# Altium schematic symbol library jlcpcb_2025_04_capacitors_extended_1210.schlib: 709 symbols (part 2 of 4) (continued)
## CC1210KKX7RYBB224
designator C?  Capacitance: 220nF  (hidden comment: *)
Capacitor, Ceramic (MLCC), 220nF, ±10%, 250V, X7R, ±10%, SMD 1210; Manufacturer: YAGEO; Manufacturer Part Number: CC1210KKX7RYBB224; Package Size: 1210; JLCPCB Basic Part: No; JLCPCB Part Number: C326671; Supplier 1: LCSC; Category: Capacitors - MLCC; Supplier Part Number 1: C326671; Tolerance: ±10%; Voltage Rating: 250V; Temperature Coefficient: X7R; RoHS: Yes; ComponentLink1Description: Datasheet; ComponentLink1URL: https://wmsc.lcsc.com/wmsc/upload/file/pdf/v2/lcsc/1811141240_YAGEO-CC1210KKX7RYBB224_C326671.pdf; ComponentLink2Description: JLCPCB Part URL; ComponentLink2URL: https://jlcpcb.com/partdetail/C326671; ComponentLink3Description: LCSC Part URL; ComponentLink3URL: https://lcsc.com/product-detail/Multilayer-Ceramic-Capacitors-MLCC---SMD-SMT_YAGEO-YAGEO-CC1210KKX7RYBB224_C326671.html
footprint CAP-1210 (1210 (3225M) Capacitor)
pins: 1, 2

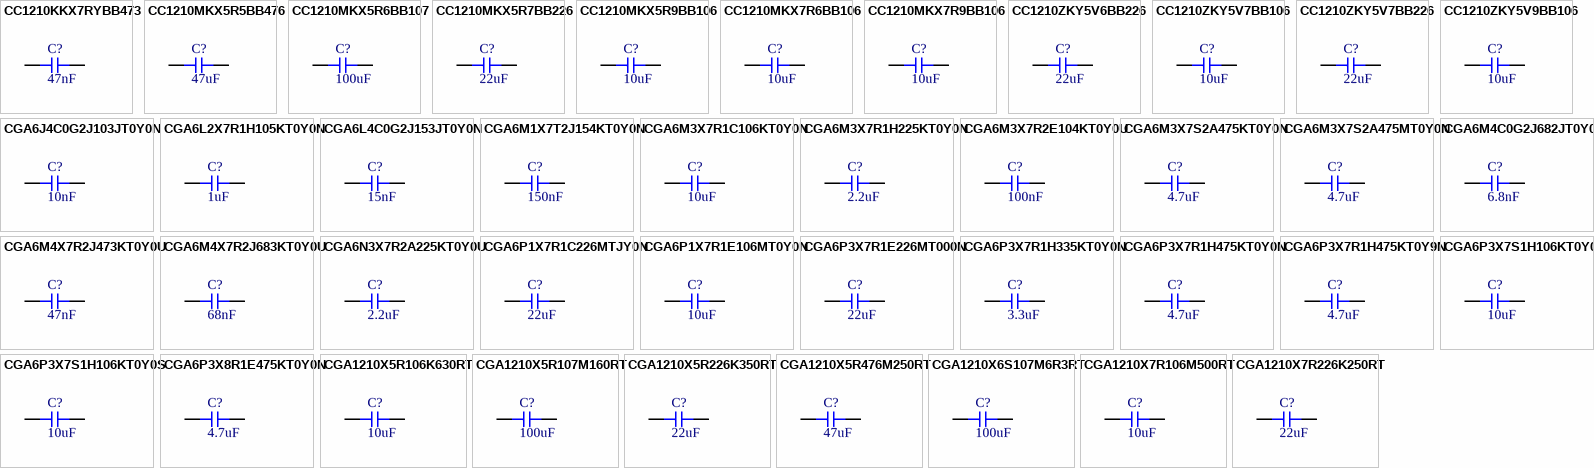
[diagram p8: symbols CC1210KKX7RYBB473 to CGA1210X7R226K250RT]

## CC1210KKX7RYBB473
designator C?  Capacitance: 47nF  (hidden comment: *)
Capacitor, Ceramic (MLCC), 47nF, ±10%, 250V, X7R, ±10%, SMD 1210; Manufacturer: YAGEO; Manufacturer Part Number: CC1210KKX7RYBB473; Package Size: 1210; JLCPCB Basic Part: No; JLCPCB Part Number: C527382; Supplier 1: LCSC; Category: Capacitors - MLCC; Supplier Part Number 1: C527382; Tolerance: ±10%; Voltage Rating: 250V; Temperature Coefficient: X7R; RoHS: Yes; ComponentLink1Description: Datasheet; ComponentLink1URL: https://wmsc.lcsc.com/wmsc/upload/file/pdf/v2/lcsc/2006101836_YAGEO-CC1210KKX7RYBB473_C527382.pdf; ComponentLink2Description: JLCPCB Part URL; ComponentLink2URL: https://jlcpcb.com/partdetail/C527382; ComponentLink3Description: LCSC Part URL; ComponentLink3URL: https://lcsc.com/product-detail/Multilayer-Ceramic-Capacitors-MLCC---SMD-SMT_YAGEO-YAGEO-CC1210KKX7RYBB473_C527382.html
footprint CAP-1210 (1210 (3225M) Capacitor)
pins: 1, 2

## CC1210MKX5R5BB476
designator C?  Capacitance: 47uF  (hidden comment: *)
Capacitor, Ceramic (MLCC), 47uF, ±20%, 6.3V, X5R, ±20%, SMD 1210; Manufacturer: YAGEO; Manufacturer Part Number: CC1210MKX5R5BB476; Package Size: 1210; JLCPCB Basic Part: No; JLCPCB Part Number: C309506; Supplier 1: LCSC; Category: Capacitors - MLCC; Supplier Part Number 1: C309506; Tolerance: ±20%; Voltage Rating: 6.3V; Temperature Coefficient: X5R; RoHS: Yes; ComponentLink1Description: Datasheet; ComponentLink1URL: https://wmsc.lcsc.com/wmsc/upload/file/pdf/v2/lcsc/2407081117_YAGEO-CC1210MKX5R5BB476_C309506.pdf; ComponentLink2Description: JLCPCB Part URL; ComponentLink2URL: https://jlcpcb.com/partdetail/C309506; ComponentLink3Description: LCSC Part URL; ComponentLink3URL: https://lcsc.com/product-detail/Multilayer-Ceramic-Capacitors-MLCC---SMD-SMT_YAGEO-YAGEO-CC1210MKX5R5BB476_C309506.html
footprint CAP-1210 (1210 (3225M) Capacitor)
pins: 1, 2

## CC1210MKX5R6BB107
designator C?  Capacitance: 100uF  (hidden comment: *)
Capacitor, Ceramic (MLCC), 100uF, ±20%, 10V, X5R, ±20%, SMD 1210; Manufacturer: YAGEO; Manufacturer Part Number: CC1210MKX5R6BB107; Package Size: 1210; JLCPCB Basic Part: No; JLCPCB Part Number: C723734; Supplier 1: LCSC; Category: Capacitors - MLCC; Supplier Part Number 1: C723734; Tolerance: ±20%; Voltage Rating: 10V; Temperature Coefficient: X5R; RoHS: Yes; ComponentLink1Description: Datasheet; ComponentLink1URL: https://wmsc.lcsc.com/wmsc/upload/file/pdf/v2/lcsc/2407081117_YAGEO-CC1210MKX5R6BB107_C723734.pdf; ComponentLink2Description: JLCPCB Part URL; ComponentLink2URL: https://jlcpcb.com/partdetail/C723734; ComponentLink3Description: LCSC Part URL; ComponentLink3URL: https://lcsc.com/product-detail/Multilayer-Ceramic-Capacitors-MLCC---SMD-SMT_YAGEO-YAGEO-CC1210MKX5R6BB107_C723734.html
footprint CAP-1210 (1210 (3225M) Capacitor)
pins: 1, 2

## CC1210MKX5R7BB226
designator C?  Capacitance: 22uF  (hidden comment: *)
Capacitor, Ceramic (MLCC), 22uF, ±20%, 16V, X5R, ±20%, SMD 1210; Manufacturer: YAGEO; Manufacturer Part Number: CC1210MKX5R7BB226; Package Size: 1210; JLCPCB Basic Part: No; JLCPCB Part Number: C2180585; Supplier 1: LCSC; Category: Capacitors - MLCC; Supplier Part Number 1: C2180585; Tolerance: ±20%; Voltage Rating: 16V; Temperature Coefficient: X5R; RoHS: Yes; ComponentLink1Description: Datasheet; ComponentLink1URL: https://wmsc.lcsc.com/wmsc/upload/file/pdf/v2/lcsc/2407081117_YAGEO-CC1210MKX5R7BB226_C2180585.pdf; ComponentLink2Description: JLCPCB Part URL; ComponentLink2URL: https://jlcpcb.com/partdetail/C2180585; ComponentLink3Description: LCSC Part URL; ComponentLink3URL: https://lcsc.com/product-detail/Multilayer-Ceramic-Capacitors-MLCC---SMD-SMT_YAGEO-YAGEO-CC1210MKX5R7BB226_C2180585.html
footprint CAP-1210 (1210 (3225M) Capacitor)
pins: 1, 2

## CC1210MKX5R9BB106
designator C?  Capacitance: 10uF  (hidden comment: *)
Capacitor, Ceramic (MLCC), 10uF, ±20%, 50V, X5R, ±20%, SMD 1210; Manufacturer: YAGEO; Manufacturer Part Number: CC1210MKX5R9BB106; Package Size: 1210; JLCPCB Basic Part: No; JLCPCB Part Number: C2177152; Supplier 1: LCSC; Category: Capacitors - MLCC; Supplier Part Number 1: C2177152; Tolerance: ±20%; Voltage Rating: 50V; Temperature Coefficient: X5R; RoHS: Yes; ComponentLink1Description: Datasheet; ComponentLink1URL: https://wmsc.lcsc.com/wmsc/upload/file/pdf/v2/lcsc/2407081117_YAGEO-CC1210MKX5R9BB106_C2177152.pdf; ComponentLink2Description: JLCPCB Part URL; ComponentLink2URL: https://jlcpcb.com/partdetail/C2177152; ComponentLink3Description: LCSC Part URL; ComponentLink3URL: https://lcsc.com/product-detail/Multilayer-Ceramic-Capacitors-MLCC---SMD-SMT_YAGEO-YAGEO-CC1210MKX5R9BB106_C2177152.html
footprint CAP-1210 (1210 (3225M) Capacitor)
pins: 1, 2

## CC1210MKX7R6BB106
designator C?  Capacitance: 10uF  (hidden comment: *)
Capacitor, Ceramic (MLCC), 10uF, ±20%, 10V, X7R, ±20%, SMD 1210; Manufacturer: YAGEO; Manufacturer Part Number: CC1210MKX7R6BB106; Package Size: 1210; JLCPCB Basic Part: No; JLCPCB Part Number: C1952584; Supplier 1: LCSC; Category: Capacitors - MLCC; Supplier Part Number 1: C1952584; Tolerance: ±20%; Voltage Rating: 10V; Temperature Coefficient: X7R; RoHS: Yes; ComponentLink1Description: Datasheet; ComponentLink1URL: https://wmsc.lcsc.com/wmsc/upload/file/pdf/v2/lcsc/2201291000_YAGEO-CC1210MKX7R6BB106_C1952584.pdf; ComponentLink2Description: JLCPCB Part URL; ComponentLink2URL: https://jlcpcb.com/partdetail/C1952584; ComponentLink3Description: LCSC Part URL; ComponentLink3URL: https://lcsc.com/product-detail/Multilayer-Ceramic-Capacitors-MLCC---SMD-SMT_YAGEO-YAGEO-CC1210MKX7R6BB106_C1952584.html
footprint CAP-1210 (1210 (3225M) Capacitor)
pins: 1, 2

## CC1210MKX7R9BB106
designator C?  Capacitance: 10uF  (hidden comment: *)
Capacitor, Ceramic (MLCC), 10uF, ±20%, 50V, X7R, ±20%, SMD 1210; Manufacturer: YAGEO; Manufacturer Part Number: CC1210MKX7R9BB106; Package Size: 1210; JLCPCB Basic Part: No; JLCPCB Part Number: C2181791; Supplier 1: LCSC; Category: Capacitors - MLCC; Supplier Part Number 1: C2181791; Tolerance: ±20%; Voltage Rating: 50V; Temperature Coefficient: X7R; RoHS: Yes; ComponentLink1Description: Datasheet; ComponentLink1URL: https://wmsc.lcsc.com/wmsc/upload/file/pdf/v2/lcsc/2202041230_YAGEO-CC1210MKX7R9BB106_C2181791.pdf; ComponentLink2Description: JLCPCB Part URL; ComponentLink2URL: https://jlcpcb.com/partdetail/C2181791; ComponentLink3Description: LCSC Part URL; ComponentLink3URL: https://lcsc.com/product-detail/Multilayer-Ceramic-Capacitors-MLCC---SMD-SMT_YAGEO-YAGEO-CC1210MKX7R9BB106_C2181791.html
footprint CAP-1210 (1210 (3225M) Capacitor)
pins: 1, 2

## CC1210ZKY5V6BB226
designator C?  Capacitance: 22uF  (hidden comment: *)
Capacitor, Ceramic (MLCC), 22uF, 10V, Y5V, SMD 1210; Manufacturer: YAGEO; Manufacturer Part Number: CC1210ZKY5V6BB226; Temperature Rating: -20%~+80%; Package Size: 1210; JLCPCB Basic Part: No; JLCPCB Part Number: C577288; Supplier 1: LCSC; Category: Capacitors - MLCC; Supplier Part Number 1: C577288; Voltage Rating: 10V; Temperature Coefficient: Y5V; RoHS: Yes; ComponentLink1Description: Datasheet; ComponentLink1URL: https://wmsc.lcsc.com/wmsc/upload/file/pdf/v2/lcsc/2311211121_YAGEO-CC1210ZKY5V6BB226_C577288.pdf; ComponentLink2Description: JLCPCB Part URL; ComponentLink2URL: https://jlcpcb.com/partdetail/C577288; ComponentLink3Description: LCSC Part URL; ComponentLink3URL: https://lcsc.com/product-detail/Multilayer-Ceramic-Capacitors-MLCC---SMD-SMT_YAGEO-YAGEO-CC1210ZKY5V6BB226_C577288.html
footprint CAP-1210 (1210 (3225M) Capacitor)
pins: 1, 2

## CC1210ZKY5V7BB106
designator C?  Capacitance: 10uF  (hidden comment: *)
Capacitor, Ceramic (MLCC), 10uF, 16V, Y5V, SMD 1210; Manufacturer: YAGEO; Manufacturer Part Number: CC1210ZKY5V7BB106; Temperature Rating: -20%~+80%; Package Size: 1210; JLCPCB Basic Part: No; JLCPCB Part Number: C577289; Supplier 1: LCSC; Category: Capacitors - MLCC; Supplier Part Number 1: C577289; Voltage Rating: 16V; Temperature Coefficient: Y5V; RoHS: Yes; ComponentLink1Description: Datasheet; ComponentLink1URL: https://wmsc.lcsc.com/wmsc/upload/file/pdf/v2/lcsc/2204121100_YAGEO-CC1210ZKY5V7BB106_C577289.pdf; ComponentLink2Description: JLCPCB Part URL; ComponentLink2URL: https://jlcpcb.com/partdetail/C577289; ComponentLink3Description: LCSC Part URL; ComponentLink3URL: https://lcsc.com/product-detail/Multilayer-Ceramic-Capacitors-MLCC---SMD-SMT_YAGEO-YAGEO-CC1210ZKY5V7BB106_C577289.html
footprint CAP-1210 (1210 (3225M) Capacitor)
pins: 1, 2

## CC1210ZKY5V7BB226
designator C?  Capacitance: 22uF  (hidden comment: *)
Capacitor, Ceramic (MLCC), 22uF, 16V, Y5V, SMD 1210; Manufacturer: YAGEO; Manufacturer Part Number: CC1210ZKY5V7BB226; Temperature Rating: -20%~+80%; Package Size: 1210; JLCPCB Basic Part: No; JLCPCB Part Number: C527383; Supplier 1: LCSC; Category: Capacitors - MLCC; Supplier Part Number 1: C527383; Voltage Rating: 16V; Temperature Coefficient: Y5V; RoHS: Yes; ComponentLink1Description: Datasheet; ComponentLink1URL: https://wmsc.lcsc.com/wmsc/upload/file/pdf/v2/lcsc/2005261833_YAGEO-CC1210ZKY5V7BB226_C527383.pdf; ComponentLink2Description: JLCPCB Part URL; ComponentLink2URL: https://jlcpcb.com/partdetail/C527383; ComponentLink3Description: LCSC Part URL; ComponentLink3URL: https://lcsc.com/product-detail/Multilayer-Ceramic-Capacitors-MLCC---SMD-SMT_YAGEO-YAGEO-CC1210ZKY5V7BB226_C527383.html
footprint CAP-1210 (1210 (3225M) Capacitor)
pins: 1, 2

## CC1210ZKY5V9BB106
designator C?  Capacitance: 10uF  (hidden comment: *)
Capacitor, Ceramic (MLCC), 10uF, 50V, Y5V, SMD 1210; Manufacturer: YAGEO; Manufacturer Part Number: CC1210ZKY5V9BB106; Temperature Rating: -20%~+80%; Package Size: 1210; JLCPCB Basic Part: No; JLCPCB Part Number: C577291; Supplier 1: LCSC; Category: Capacitors - MLCC; Supplier Part Number 1: C577291; Voltage Rating: 50V; Temperature Coefficient: Y5V; RoHS: Yes; ComponentLink1Description: Datasheet; ComponentLink1URL: https://wmsc.lcsc.com/wmsc/upload/file/pdf/v2/lcsc/2006091815_YAGEO-CC1210ZKY5V9BB106_C577291.pdf; ComponentLink2Description: JLCPCB Part URL; ComponentLink2URL: https://jlcpcb.com/partdetail/C577291; ComponentLink3Description: LCSC Part URL; ComponentLink3URL: https://lcsc.com/product-detail/Multilayer-Ceramic-Capacitors-MLCC---SMD-SMT_YAGEO-YAGEO-CC1210ZKY5V9BB106_C577291.html
footprint CAP-1210 (1210 (3225M) Capacitor)
pins: 1, 2

## CGA6J4C0G2J103JT0Y0N
designator C?  Capacitance: 10nF  (hidden comment: *)
Capacitor, Ceramic (MLCC), 10nF, ±5%, 630V, C0G, ±5%, SMD 1210; Manufacturer: TDK; Manufacturer Part Number: CGA6J4C0G2J103JT0Y0N; Package Size: 1210; JLCPCB Basic Part: No; JLCPCB Part Number: C338089; Supplier 1: LCSC; Category: Capacitors - MLCC; Supplier Part Number 1: C338089; Tolerance: ±5%; Voltage Rating: 630V; Temperature Coefficient: C0G; RoHS: Yes; ComponentLink1Description: Datasheet; ComponentLink1URL: https://wmsc.lcsc.com/wmsc/upload/file/pdf/v2/lcsc/2304140030_TDK-CGA6J4C0G2J103JT0Y0N_C338089.pdf; ComponentLink2Description: JLCPCB Part URL; ComponentLink2URL: https://jlcpcb.com/partdetail/C338089; ComponentLink3Description: LCSC Part URL; ComponentLink3URL: https://lcsc.com/product-detail/Multilayer-Ceramic-Capacitors-MLCC---SMD-SMT_TDK-TDK-CGA6J4C0G2J103JT0Y0N_C338089.html
footprint CAP-1210 (1210 (3225M) Capacitor)
pins: 1, 2

## CGA6L2X7R1H105KT0Y0N
designator C?  Capacitance: 1uF  (hidden comment: *)
Capacitor, Ceramic (MLCC), 1uF, ±10%, 50V, X7R, ±10%, SMD 1210; Manufacturer: TDK; Manufacturer Part Number: CGA6L2X7R1H105KT0Y0N; Package Size: 1210; JLCPCB Basic Part: No; JLCPCB Part Number: C342727; Supplier 1: LCSC; Category: Capacitors - MLCC; Supplier Part Number 1: C342727; Tolerance: ±10%; Voltage Rating: 50V; Temperature Coefficient: X7R; RoHS: Yes; ComponentLink1Description: Datasheet; ComponentLink1URL: https://wmsc.lcsc.com/wmsc/upload/file/pdf/v2/lcsc/2304140030_TDK-CGA6L2X7R1H105KT0Y0N_C342727.pdf; ComponentLink2Description: JLCPCB Part URL; ComponentLink2URL: https://jlcpcb.com/partdetail/C342727; ComponentLink3Description: LCSC Part URL; ComponentLink3URL: https://lcsc.com/product-detail/Multilayer-Ceramic-Capacitors-MLCC---SMD-SMT_TDK-TDK-CGA6L2X7R1H105KT0Y0N_C342727.html
footprint CAP-1210 (1210 (3225M) Capacitor)
pins: 1, 2

## CGA6L4C0G2J153JT0Y0N
designator C?  Capacitance: 15nF  (hidden comment: *)
Capacitor, Ceramic (MLCC), 15nF, ±5%, 630V, C0G, ±5%, SMD 1210; Manufacturer: TDK; Manufacturer Part Number: CGA6L4C0G2J153JT0Y0N; Package Size: 1210; JLCPCB Basic Part: No; JLCPCB Part Number: C694519; Supplier 1: LCSC; Category: Capacitors - MLCC; Supplier Part Number 1: C694519; Tolerance: ±5%; Voltage Rating: 630V; Temperature Coefficient: C0G; RoHS: Yes; ComponentLink1Description: Datasheet; ComponentLink1URL: https://wmsc.lcsc.com/wmsc/upload/file/pdf/v2/lcsc/2304140030_TDK-CGA6L4C0G2J153JT0Y0N_C694519.pdf; ComponentLink2Description: JLCPCB Part URL; ComponentLink2URL: https://jlcpcb.com/partdetail/C694519; ComponentLink3Description: LCSC Part URL; ComponentLink3URL: https://lcsc.com/product-detail/Multilayer-Ceramic-Capacitors-MLCC---SMD-SMT_TDK-TDK-CGA6L4C0G2J153JT0Y0N_C694519.html
footprint CAP-1210 (1210 (3225M) Capacitor)
pins: 1, 2

## CGA6M1X7T2J154KT0Y0N
designator C?  Capacitance: 150nF  (hidden comment: *)
Capacitor, Ceramic (MLCC), 150nF, ±10%, 630V, X7T, ±10%, SMD 1210; Manufacturer: TDK; Manufacturer Part Number: CGA6M1X7T2J154KT0Y0N; Package Size: 1210; JLCPCB Basic Part: No; JLCPCB Part Number: C445687; Supplier 1: LCSC; Category: Capacitors - MLCC; Supplier Part Number 1: C445687; Tolerance: ±10%; Voltage Rating: 630V; Temperature Coefficient: X7T; RoHS: Yes; ComponentLink1Description: Datasheet; ComponentLink1URL: https://wmsc.lcsc.com/wmsc/upload/file/pdf/v2/lcsc/2304140030_TDK-CGA6M1X7T2J154KT0Y0N_C445687.pdf; ComponentLink2Description: JLCPCB Part URL; ComponentLink2URL: https://jlcpcb.com/partdetail/C445687; ComponentLink3Description: LCSC Part URL; ComponentLink3URL: https://lcsc.com/product-detail/Multilayer-Ceramic-Capacitors-MLCC---SMD-SMT_TDK-TDK-CGA6M1X7T2J154KT0Y0N_C445687.html
footprint CAP-1210 (1210 (3225M) Capacitor)
pins: 1, 2

## CGA6M3X7R1C106KT0Y0N
designator C?  Capacitance: 10uF  (hidden comment: *)
Capacitor, Ceramic (MLCC), 10uF, ±10%, 16V, X7R, ±10%, SMD 1210; Manufacturer: TDK; Manufacturer Part Number: CGA6M3X7R1C106KT0Y0N; Package Size: 1210; JLCPCB Basic Part: No; JLCPCB Part Number: C432950; Supplier 1: LCSC; Category: Capacitors - MLCC; Supplier Part Number 1: C432950; Tolerance: ±10%; Voltage Rating: 16V; Temperature Coefficient: X7R; RoHS: Yes; ComponentLink1Description: Datasheet; ComponentLink1URL: https://wmsc.lcsc.com/wmsc/upload/file/pdf/v2/lcsc/2304140030_TDK-CGA6M3X7R1C106KT0Y0N_C432950.pdf; ComponentLink2Description: JLCPCB Part URL; ComponentLink2URL: https://jlcpcb.com/partdetail/C432950; ComponentLink3Description: LCSC Part URL; ComponentLink3URL: https://lcsc.com/product-detail/Multilayer-Ceramic-Capacitors-MLCC---SMD-SMT_TDK-TDK-CGA6M3X7R1C106KT0Y0N_C432950.html
footprint CAP-1210 (1210 (3225M) Capacitor)
pins: 1, 2

## CGA6M3X7R1H225KT0Y0N
designator C?  Capacitance: 2.2uF  (hidden comment: *)
Capacitor, Ceramic (MLCC), 2.2uF, ±10%, 50V, X7R, ±10%, SMD 1210; Manufacturer: TDK; Manufacturer Part Number: CGA6M3X7R1H225KT0Y0N; Package Size: 1210; JLCPCB Basic Part: No; JLCPCB Part Number: C342678; Supplier 1: LCSC; Category: Capacitors - MLCC; Supplier Part Number 1: C342678; Tolerance: ±10%; Voltage Rating: 50V; Temperature Coefficient: X7R; RoHS: Yes; ComponentLink1Description: Datasheet; ComponentLink1URL: https://wmsc.lcsc.com/wmsc/upload/file/pdf/v2/lcsc/2304140030_TDK-CGA6M3X7R1H225KT0Y0N_C342678.pdf; ComponentLink2Description: JLCPCB Part URL; ComponentLink2URL: https://jlcpcb.com/partdetail/C342678; ComponentLink3Description: LCSC Part URL; ComponentLink3URL: https://lcsc.com/product-detail/Multilayer-Ceramic-Capacitors-MLCC---SMD-SMT_TDK-TDK-CGA6M3X7R1H225KT0Y0N_C342678.html
footprint CAP-1210 (1210 (3225M) Capacitor)
pins: 1, 2

## CGA6M3X7R2E104KT0Y0U
designator C?  Capacitance: 100nF  (hidden comment: *)
Capacitor, Ceramic (MLCC), 100nF, ±10%, 250V, X7R, ±10%, SMD 1210; Manufacturer: TDK; Manufacturer Part Number: CGA6M3X7R2E104KT0Y0U; Package Size: 1210; JLCPCB Basic Part: No; JLCPCB Part Number: C338090; Supplier 1: LCSC; Category: Capacitors - MLCC; Supplier Part Number 1: C338090; Tolerance: ±10%; Voltage Rating: 250V; Temperature Coefficient: X7R; RoHS: Yes; ComponentLink1Description: Datasheet; ComponentLink1URL: https://wmsc.lcsc.com/wmsc/upload/file/pdf/v2/lcsc/2304140030_TDK-CGA6M3X7R2E104KT0Y0U_C338090.pdf; ComponentLink2Description: JLCPCB Part URL; ComponentLink2URL: https://jlcpcb.com/partdetail/C338090; ComponentLink3Description: LCSC Part URL; ComponentLink3URL: https://lcsc.com/product-detail/Multilayer-Ceramic-Capacitors-MLCC---SMD-SMT_TDK-TDK-CGA6M3X7R2E104KT0Y0U_C338090.html
footprint CAP-1210 (1210 (3225M) Capacitor)
pins: 1, 2

## CGA6M3X7S2A475KT0Y0N
designator C?  Capacitance: 4.7uF  (hidden comment: *)
Capacitor, Ceramic (MLCC), 4.7uF, ±10%, 100V, X7S, ±10%, SMD 1210; Manufacturer: TDK; Manufacturer Part Number: CGA6M3X7S2A475KT0Y0N; Package Size: 1210; JLCPCB Basic Part: No; JLCPCB Part Number: C329955; Supplier 1: LCSC; Category: Capacitors - MLCC; Supplier Part Number 1: C329955; Tolerance: ±10%; Voltage Rating: 100V; Temperature Coefficient: X7S; RoHS: Yes; ComponentLink1Description: Datasheet; ComponentLink1URL: https://wmsc.lcsc.com/wmsc/upload/file/pdf/v2/lcsc/2304140030_TDK-CGA6M3X7S2A475KT0Y0N_C329955.pdf; ComponentLink2Description: JLCPCB Part URL; ComponentLink2URL: https://jlcpcb.com/partdetail/C329955; ComponentLink3Description: LCSC Part URL; ComponentLink3URL: https://lcsc.com/product-detail/Multilayer-Ceramic-Capacitors-MLCC---SMD-SMT_TDK-TDK-CGA6M3X7S2A475KT0Y0N_C329955.html
footprint CAP-1210 (1210 (3225M) Capacitor)
pins: 1, 2

## CGA6M3X7S2A475MT0Y0N
designator C?  Capacitance: 4.7uF  (hidden comment: *)
Capacitor, Ceramic (MLCC), 4.7uF, ±20%, 100V, X7S, ±20%, SMD 1210; Manufacturer: TDK; Manufacturer Part Number: CGA6M3X7S2A475MT0Y0N; Package Size: 1210; JLCPCB Basic Part: No; JLCPCB Part Number: C5221345; Supplier 1: LCSC; Category: Capacitors - MLCC; Supplier Part Number 1: C5221345; Tolerance: ±20%; Voltage Rating: 100V; Temperature Coefficient: X7S; RoHS: Yes; ComponentLink1Description: Datasheet; ComponentLink1URL: https://wmsc.lcsc.com/wmsc/upload/file/pdf/v2/lcsc/2210271800_TDK-CGA6M3X7S2A475MT0Y0N_C5221345.pdf; ComponentLink2Description: JLCPCB Part URL; ComponentLink2URL: https://jlcpcb.com/partdetail/C5221345; ComponentLink3Description: LCSC Part URL; ComponentLink3URL: https://lcsc.com/product-detail/Multilayer-Ceramic-Capacitors-MLCC---SMD-SMT_TDK-TDK-CGA6M3X7S2A475MT0Y0N_C5221345.html
footprint CAP-1210 (1210 (3225M) Capacitor)
pins: 1, 2

## CGA6M4C0G2J682JT0Y0N
designator C?  Capacitance: 6.8nF  (hidden comment: *)
Capacitor, Ceramic (MLCC), 6.8nF, ±5%, 630V, C0G, ±5%, SMD 1210; Manufacturer: TDK; Manufacturer Part Number: CGA6M4C0G2J682JT0Y0N; Package Size: 1210; JLCPCB Basic Part: No; JLCPCB Part Number: C342687; Supplier 1: LCSC; Category: Capacitors - MLCC; Supplier Part Number 1: C342687; Tolerance: ±5%; Voltage Rating: 630V; Temperature Coefficient: C0G; RoHS: Yes; ComponentLink1Description: Datasheet; ComponentLink1URL: https://wmsc.lcsc.com/wmsc/upload/file/pdf/v2/lcsc/2208230930_TDK-CGA6M4C0G2J682JT0Y0N_C342687.pdf; ComponentLink2Description: JLCPCB Part URL; ComponentLink2URL: https://jlcpcb.com/partdetail/C342687; ComponentLink3Description: LCSC Part URL; ComponentLink3URL: https://lcsc.com/product-detail/Multilayer-Ceramic-Capacitors-MLCC---SMD-SMT_TDK-TDK-CGA6M4C0G2J682JT0Y0N_C342687.html
footprint CAP-1210 (1210 (3225M) Capacitor)
pins: 1, 2

## CGA6M4X7R2J473KT0Y0U
designator C?  Capacitance: 47nF  (hidden comment: *)
Capacitor, Ceramic (MLCC), 47nF, ±10%, 630V, X7R, ±10%, SMD 1210; Manufacturer: TDK; Manufacturer Part Number: CGA6M4X7R2J473KT0Y0U; Package Size: 1210; JLCPCB Basic Part: No; JLCPCB Part Number: C445705; Supplier 1: LCSC; Category: Capacitors - MLCC; Supplier Part Number 1: C445705; Tolerance: ±10%; Voltage Rating: 630V; Temperature Coefficient: X7R; RoHS: Yes; ComponentLink1Description: Datasheet; ComponentLink1URL: https://wmsc.lcsc.com/wmsc/upload/file/pdf/v2/lcsc/2304140030_TDK-CGA6M4X7R2J473KT0Y0U_C445705.pdf; ComponentLink2Description: JLCPCB Part URL; ComponentLink2URL: https://jlcpcb.com/partdetail/C445705; ComponentLink3Description: LCSC Part URL; ComponentLink3URL: https://lcsc.com/product-detail/Multilayer-Ceramic-Capacitors-MLCC---SMD-SMT_TDK-TDK-CGA6M4X7R2J473KT0Y0U_C445705.html
footprint CAP-1210 (1210 (3225M) Capacitor)
pins: 1, 2

## CGA6M4X7R2J683KT0Y0U
designator C?  Capacitance: 68nF  (hidden comment: *)
Capacitor, Ceramic (MLCC), 68nF, ±10%, 630V, X7R, ±10%, SMD 1210; Manufacturer: TDK; Manufacturer Part Number: CGA6M4X7R2J683KT0Y0U; Package Size: 1210; JLCPCB Basic Part: No; JLCPCB Part Number: C342703; Supplier 1: LCSC; Category: Capacitors - MLCC; Supplier Part Number 1: C342703; Tolerance: ±10%; Voltage Rating: 630V; Temperature Coefficient: X7R; RoHS: Yes; ComponentLink1Description: Datasheet; ComponentLink1URL: https://wmsc.lcsc.com/wmsc/upload/file/pdf/v2/lcsc/2304140030_TDK-CGA6M4X7R2J683KT0Y0U_C342703.pdf; ComponentLink2Description: JLCPCB Part URL; ComponentLink2URL: https://jlcpcb.com/partdetail/C342703; ComponentLink3Description: LCSC Part URL; ComponentLink3URL: https://lcsc.com/product-detail/Multilayer-Ceramic-Capacitors-MLCC---SMD-SMT_TDK-TDK-CGA6M4X7R2J683KT0Y0U_C342703.html
footprint CAP-1210 (1210 (3225M) Capacitor)
pins: 1, 2

## CGA6N3X7R2A225KT0Y0U
designator C?  Capacitance: 2.2uF  (hidden comment: *)
Capacitor, Ceramic (MLCC), 2.2uF, ±10%, 100V, X7R, ±10%, SMD 1210; Manufacturer: TDK; Manufacturer Part Number: CGA6N3X7R2A225KT0Y0U; Package Size: 1210; JLCPCB Basic Part: No; JLCPCB Part Number: C342652; Supplier 1: LCSC; Category: Capacitors - MLCC; Supplier Part Number 1: C342652; Tolerance: ±10%; Voltage Rating: 100V; Temperature Coefficient: X7R; RoHS: Yes; ComponentLink1Description: Datasheet; ComponentLink1URL: https://wmsc.lcsc.com/wmsc/upload/file/pdf/v2/lcsc/2304140030_TDK-CGA6N3X7R2A225KT0Y0U_C342652.pdf; ComponentLink2Description: JLCPCB Part URL; ComponentLink2URL: https://jlcpcb.com/partdetail/C342652; ComponentLink3Description: LCSC Part URL; ComponentLink3URL: https://lcsc.com/product-detail/Multilayer-Ceramic-Capacitors-MLCC---SMD-SMT_TDK-TDK-CGA6N3X7R2A225KT0Y0U_C342652.html
footprint CAP-1210 (1210 (3225M) Capacitor)
pins: 1, 2

## CGA6P1X7R1C226MTJY0N
designator C?  Capacitance: 22uF  (hidden comment: *)
Capacitor, Ceramic (MLCC), 22uF, ±20%, 16V, X7R, ±20%, SMD 1210; Manufacturer: TDK; Manufacturer Part Number: CGA6P1X7R1C226MTJY0N; Package Size: 1210; JLCPCB Basic Part: No; JLCPCB Part Number: C342674; Supplier 1: LCSC; Category: Capacitors - MLCC; Supplier Part Number 1: C342674; Tolerance: ±20%; Voltage Rating: 16V; Temperature Coefficient: X7R; RoHS: Yes; ComponentLink1Description: Datasheet; ComponentLink1URL: https://wmsc.lcsc.com/wmsc/upload/file/pdf/v2/lcsc/2304140030_TDK-CGA6P1X7R1C226MTJY0N_C342674.pdf; ComponentLink2Description: JLCPCB Part URL; ComponentLink2URL: https://jlcpcb.com/partdetail/C342674; ComponentLink3Description: LCSC Part URL; ComponentLink3URL: https://lcsc.com/product-detail/Multilayer-Ceramic-Capacitors-MLCC---SMD-SMT_TDK-TDK-CGA6P1X7R1C226MTJY0N_C342674.html
footprint CAP-1210 (1210 (3225M) Capacitor)
pins: 1, 2

## CGA6P1X7R1E106MT0Y0N
designator C?  Capacitance: 10uF  (hidden comment: *)
Capacitor, Ceramic (MLCC), 10uF, ±20%, 25V, X7R, ±20%, SMD 1210; Manufacturer: TDK; Manufacturer Part Number: CGA6P1X7R1E106MT0Y0N; Package Size: 1210; JLCPCB Basic Part: No; JLCPCB Part Number: C342710; Supplier 1: LCSC; Category: Capacitors - MLCC; Supplier Part Number 1: C342710; Tolerance: ±20%; Voltage Rating: 25V; Temperature Coefficient: X7R; RoHS: Yes; ComponentLink1Description: Datasheet; ComponentLink1URL: https://wmsc.lcsc.com/wmsc/upload/file/pdf/v2/lcsc/2304140030_TDK-CGA6P1X7R1E106MT0Y0N_C342710.pdf; ComponentLink2Description: JLCPCB Part URL; ComponentLink2URL: https://jlcpcb.com/partdetail/C342710; ComponentLink3Description: LCSC Part URL; ComponentLink3URL: https://lcsc.com/product-detail/Multilayer-Ceramic-Capacitors-MLCC---SMD-SMT_TDK-TDK-CGA6P1X7R1E106MT0Y0N_C342710.html
footprint CAP-1210 (1210 (3225M) Capacitor)
pins: 1, 2

## CGA6P3X7R1E226MT000N
designator C?  Capacitance: 22uF  (hidden comment: *)
Capacitor, Ceramic (MLCC), 22uF, ±20%, 25V, X7R, ±20%, SMD 1210; Manufacturer: TDK; Manufacturer Part Number: CGA6P3X7R1E226MT000N; Package Size: 1210; JLCPCB Basic Part: No; JLCPCB Part Number: C694521; Supplier 1: LCSC; Category: Capacitors - MLCC; Supplier Part Number 1: C694521; Tolerance: ±20%; Voltage Rating: 25V; Temperature Coefficient: X7R; RoHS: Yes; ComponentLink1Description: Datasheet; ComponentLink1URL: https://wmsc.lcsc.com/wmsc/upload/file/pdf/v2/lcsc/2011051905_TDK-CGA6P3X7R1E226MT000N_C694521.pdf; ComponentLink2Description: JLCPCB Part URL; ComponentLink2URL: https://jlcpcb.com/partdetail/C694521; ComponentLink3Description: LCSC Part URL; ComponentLink3URL: https://lcsc.com/product-detail/Multilayer-Ceramic-Capacitors-MLCC---SMD-SMT_TDK-TDK-CGA6P3X7R1E226MT000N_C694521.html
footprint CAP-1210 (1210 (3225M) Capacitor)
pins: 1, 2

## CGA6P3X7R1H335KT0Y0N
designator C?  Capacitance: 3.3uF  (hidden comment: *)
Capacitor, Ceramic (MLCC), 3.3uF, ±10%, 50V, X7R, ±10%, SMD 1210; Manufacturer: TDK; Manufacturer Part Number: CGA6P3X7R1H335KT0Y0N; Package Size: 1210; JLCPCB Basic Part: No; JLCPCB Part Number: C432952; Supplier 1: LCSC; Category: Capacitors - MLCC; Supplier Part Number 1: C432952; Tolerance: ±10%; Voltage Rating: 50V; Temperature Coefficient: X7R; RoHS: Yes; ComponentLink1Description: Datasheet; ComponentLink1URL: https://wmsc.lcsc.com/wmsc/upload/file/pdf/v2/lcsc/2304140030_TDK-CGA6P3X7R1H335KT0Y0N_C432952.pdf; ComponentLink2Description: JLCPCB Part URL; ComponentLink2URL: https://jlcpcb.com/partdetail/C432952; ComponentLink3Description: LCSC Part URL; ComponentLink3URL: https://lcsc.com/product-detail/Multilayer-Ceramic-Capacitors-MLCC---SMD-SMT_TDK-TDK-CGA6P3X7R1H335KT0Y0N_C432952.html
footprint CAP-1210 (1210 (3225M) Capacitor)
pins: 1, 2

## CGA6P3X7R1H475KT0Y0N
designator C?  Capacitance: 4.7uF  (hidden comment: *)
Capacitor, Ceramic (MLCC), 4.7uF, ±10%, 50V, X7R, ±10%, SMD 1210; Manufacturer: TDK; Manufacturer Part Number: CGA6P3X7R1H475KT0Y0N; Package Size: 1210; JLCPCB Basic Part: No; JLCPCB Part Number: C342648; Supplier 1: LCSC; Category: Capacitors - MLCC; Supplier Part Number 1: C342648; Tolerance: ±10%; Voltage Rating: 50V; Temperature Coefficient: X7R; RoHS: Yes; ComponentLink1Description: Datasheet; ComponentLink1URL: https://wmsc.lcsc.com/wmsc/upload/file/pdf/v2/lcsc/2304140030_TDK-CGA6P3X7R1H475KT0Y0N_C342648.pdf; ComponentLink2Description: JLCPCB Part URL; ComponentLink2URL: https://jlcpcb.com/partdetail/C342648; ComponentLink3Description: LCSC Part URL; ComponentLink3URL: https://lcsc.com/product-detail/Multilayer-Ceramic-Capacitors-MLCC---SMD-SMT_TDK-TDK-CGA6P3X7R1H475KT0Y0N_C342648.html
footprint CAP-1210 (1210 (3225M) Capacitor)
pins: 1, 2

## CGA6P3X7R1H475KT0Y9N
designator C?  Capacitance: 4.7uF  (hidden comment: *)
Capacitor, Ceramic (MLCC), 4.7uF, ±10%, 50V, X7R, ±10%, SMD 1210; Manufacturer: TDK; Manufacturer Part Number: CGA6P3X7R1H475KT0Y9N; Package Size: 1210; JLCPCB Basic Part: No; JLCPCB Part Number: C342649; Supplier 1: LCSC; Category: Capacitors - MLCC; Supplier Part Number 1: C342649; Tolerance: ±10%; Voltage Rating: 50V; Temperature Coefficient: X7R; RoHS: Yes; ComponentLink1Description: Datasheet; ComponentLink1URL: https://wmsc.lcsc.com/wmsc/upload/file/pdf/v2/lcsc/2304140030_TDK-CGA6P3X7R1H475KT0Y9N_C342649.pdf; ComponentLink2Description: JLCPCB Part URL; ComponentLink2URL: https://jlcpcb.com/partdetail/C342649; ComponentLink3Description: LCSC Part URL; ComponentLink3URL: https://lcsc.com/product-detail/Multilayer-Ceramic-Capacitors-MLCC---SMD-SMT_TDK-TDK-CGA6P3X7R1H475KT0Y9N_C342649.html
footprint CAP-1210 (1210 (3225M) Capacitor)
pins: 1, 2

## CGA6P3X7S1H106KT0Y0N
designator C?  Capacitance: 10uF  (hidden comment: *)
Capacitor, Ceramic (MLCC), 10uF, ±10%, 50V, X7S, ±10%, SMD 1210; Manufacturer: TDK; Manufacturer Part Number: CGA6P3X7S1H106KT0Y0N; Package Size: 1210; JLCPCB Basic Part: No; JLCPCB Part Number: C342616; Supplier 1: LCSC; Category: Capacitors - MLCC; Supplier Part Number 1: C342616; Tolerance: ±10%; Voltage Rating: 50V; Temperature Coefficient: X7S; RoHS: Yes; ComponentLink1Description: Datasheet; ComponentLink1URL: https://wmsc.lcsc.com/wmsc/upload/file/pdf/v2/lcsc/2304140030_TDK-CGA6P3X7S1H106KT0Y0N_C342616.pdf; ComponentLink2Description: JLCPCB Part URL; ComponentLink2URL: https://jlcpcb.com/partdetail/C342616; ComponentLink3Description: LCSC Part URL; ComponentLink3URL: https://lcsc.com/product-detail/Multilayer-Ceramic-Capacitors-MLCC---SMD-SMT_TDK-TDK-CGA6P3X7S1H106KT0Y0N_C342616.html
footprint CAP-1210 (1210 (3225M) Capacitor)
pins: 1, 2

## CGA6P3X7S1H106KT0Y0S
designator C?  Capacitance: 10uF  (hidden comment: *)
Capacitor, Ceramic (MLCC), 10uF, ±10%, 50V, X7S, ±10%, SMD 1210; Manufacturer: TDK; Manufacturer Part Number: CGA6P3X7S1H106KT0Y0S; Package Size: 1210; JLCPCB Basic Part: No; JLCPCB Part Number: C432953; Supplier 1: LCSC; Category: Capacitors - MLCC; Supplier Part Number 1: C432953; Tolerance: ±10%; Voltage Rating: 50V; Temperature Coefficient: X7S; RoHS: Yes; ComponentLink1Description: Datasheet; ComponentLink1URL: https://wmsc.lcsc.com/wmsc/upload/file/pdf/v2/lcsc/2304140030_TDK-CGA6P3X7S1H106KT0Y0S_C432953.pdf; ComponentLink2Description: JLCPCB Part URL; ComponentLink2URL: https://jlcpcb.com/partdetail/C432953; ComponentLink3Description: LCSC Part URL; ComponentLink3URL: https://lcsc.com/product-detail/Multilayer-Ceramic-Capacitors-MLCC---SMD-SMT_TDK-TDK-CGA6P3X7S1H106KT0Y0S_C432953.html
footprint CAP-1210 (1210 (3225M) Capacitor)
pins: 1, 2

## CGA6P3X8R1E475KT0Y0N
designator C?  Capacitance: 4.7uF  (hidden comment: *)
Capacitor, Ceramic (MLCC), 4.7uF, ±10%, 25V, X8R, ±10%, SMD 1210; Manufacturer: TDK; Manufacturer Part Number: CGA6P3X8R1E475KT0Y0N; Package Size: 1210; JLCPCB Basic Part: No; JLCPCB Part Number: C342597; Supplier 1: LCSC; Category: Capacitors - MLCC; Supplier Part Number 1: C342597; Tolerance: ±10%; Voltage Rating: 25V; Temperature Coefficient: X8R; RoHS: Yes; ComponentLink1Description: Datasheet; ComponentLink1URL: https://wmsc.lcsc.com/wmsc/upload/file/pdf/v2/lcsc/2108171930_TDK-CGA6P3X8R1E475KT0Y0N_C342597.pdf; ComponentLink2Description: JLCPCB Part URL; ComponentLink2URL: https://jlcpcb.com/partdetail/C342597; ComponentLink3Description: LCSC Part URL; ComponentLink3URL: https://lcsc.com/product-detail/Multilayer-Ceramic-Capacitors-MLCC---SMD-SMT_TDK-TDK-CGA6P3X8R1E475KT0Y0N_C342597.html
footprint CAP-1210 (1210 (3225M) Capacitor)
pins: 1, 2

## CGA1210X5R106K630RT
designator C?  Capacitance: 10uF  (hidden comment: *)
Capacitor, Ceramic (MLCC), 10uF, ±10%, 63V, X5R, ±10%, SMD 1210; Manufacturer: HRE; Manufacturer Part Number: CGA1210X5R106K630RT; Package Size: 1210; JLCPCB Basic Part: No; JLCPCB Part Number: C6120012; Supplier 1: LCSC; Category: Capacitors - MLCC; Supplier Part Number 1: C6120012; Tolerance: ±10%; Voltage Rating: 63V; Temperature Coefficient: X5R; RoHS: Yes; ComponentLink1Description: Datasheet; ComponentLink2Description: JLCPCB Part URL; ComponentLink2URL: https://jlcpcb.com/partdetail/C6120012; ComponentLink3Description: LCSC Part URL; ComponentLink3URL: https://lcsc.com/product-detail/Multilayer-Ceramic-Capacitors-MLCC---SMD-SMT_HRE-HRE-CGA1210X5R106K630RT_C6120012.html
footprint CAP-1210 (1210 (3225M) Capacitor)
pins: 1, 2

## CGA1210X5R107M160RT
designator C?  Capacitance: 100uF  (hidden comment: *)
Capacitor, Ceramic (MLCC), 100uF, ±20%, 16V, X5R, ±20%, SMD 1210; Manufacturer: HRE; Manufacturer Part Number: CGA1210X5R107M160RT; Package Size: 1210; JLCPCB Basic Part: No; JLCPCB Part Number: C6120014; Supplier 1: LCSC; Category: Capacitors - MLCC; Supplier Part Number 1: C6120014; Tolerance: ±20%; Voltage Rating: 16V; Temperature Coefficient: X5R; RoHS: Yes; ComponentLink1Description: Datasheet; ComponentLink1URL: https://wmsc.lcsc.com/wmsc/upload/file/pdf/v2/lcsc/2307241619_HRE-CGA1210X5R107M160RT_C6120014.pdf; ComponentLink2Description: JLCPCB Part URL; ComponentLink2URL: https://jlcpcb.com/partdetail/C6120014; ComponentLink3Description: LCSC Part URL; ComponentLink3URL: https://lcsc.com/product-detail/Multilayer-Ceramic-Capacitors-MLCC---SMD-SMT_HRE-HRE-CGA1210X5R107M160RT_C6120014.html
footprint CAP-1210 (1210 (3225M) Capacitor)
pins: 1, 2

## CGA1210X5R226K350RT
designator C?  Capacitance: 22uF  (hidden comment: *)
Capacitor, Ceramic (MLCC), 22uF, ±10%, 35V, X5R, ±10%, SMD 1210; Manufacturer: HRE; Manufacturer Part Number: CGA1210X5R226K350RT; Package Size: 1210; JLCPCB Basic Part: No; JLCPCB Part Number: C6120016; Supplier 1: LCSC; Category: Capacitors - MLCC; Supplier Part Number 1: C6120016; Tolerance: ±10%; Voltage Rating: 35V; Temperature Coefficient: X5R; RoHS: Yes; ComponentLink1Description: Datasheet; ComponentLink1URL: https://wmsc.lcsc.com/wmsc/upload/file/pdf/v2/lcsc/2402291547_HRE-CGA1210X5R226K350RT_C6120016.pdf; ComponentLink2Description: JLCPCB Part URL; ComponentLink2URL: https://jlcpcb.com/partdetail/C6120016; ComponentLink3Description: LCSC Part URL; ComponentLink3URL: https://lcsc.com/product-detail/Multilayer-Ceramic-Capacitors-MLCC---SMD-SMT_HRE-HRE-CGA1210X5R226K350RT_C6120016.html
footprint CAP-1210 (1210 (3225M) Capacitor)
pins: 1, 2

## CGA1210X5R476M250RT
designator C?  Capacitance: 47uF  (hidden comment: *)
Capacitor, Ceramic (MLCC), 47uF, ±20%, 25V, X5R, ±20%, SMD 1210; Manufacturer: HRE; Manufacturer Part Number: CGA1210X5R476M250RT; Package Size: 1210; JLCPCB Basic Part: No; JLCPCB Part Number: C6120020; Supplier 1: LCSC; Category: Capacitors - MLCC; Supplier Part Number 1: C6120020; Tolerance: ±20%; Voltage Rating: 25V; Temperature Coefficient: X5R; RoHS: Yes; ComponentLink1Description: Datasheet; ComponentLink1URL: https://wmsc.lcsc.com/wmsc/upload/file/pdf/v2/lcsc/2402180933_HRE-CGA1210X5R476M250RT_C6120020.pdf; ComponentLink2Description: JLCPCB Part URL; ComponentLink2URL: https://jlcpcb.com/partdetail/C6120020; ComponentLink3Description: LCSC Part URL; ComponentLink3URL: https://lcsc.com/product-detail/Multilayer-Ceramic-Capacitors-MLCC---SMD-SMT_HRE-HRE-CGA1210X5R476M250RT_C6120020.html
footprint CAP-1210 (1210 (3225M) Capacitor)
pins: 1, 2

## CGA1210X6S107M6R3RT
designator C?  Capacitance: 100uF  (hidden comment: *)
Capacitor, Ceramic (MLCC), 100uF, ±20%, 6.3V, X6S, ±20%, SMD 1210; Manufacturer: HRE; Manufacturer Part Number: CGA1210X6S107M6R3RT; Package Size: 1210; JLCPCB Basic Part: No; JLCPCB Part Number: C6120022; Supplier 1: LCSC; Category: Capacitors - MLCC; Supplier Part Number 1: C6120022; Tolerance: ±20%; Voltage Rating: 6.3V; Temperature Coefficient: X6S; RoHS: Yes; ComponentLink1Description: Datasheet; ComponentLink2Description: JLCPCB Part URL; ComponentLink2URL: https://jlcpcb.com/partdetail/C6120022; ComponentLink3Description: LCSC Part URL; ComponentLink3URL: https://lcsc.com/product-detail/Multilayer-Ceramic-Capacitors-MLCC---SMD-SMT_HRE-HRE-CGA1210X6S107M6R3RT_C6120022.html
footprint CAP-1210 (1210 (3225M) Capacitor)
pins: 1, 2

## CGA1210X7R106M500RT
designator C?  Capacitance: 10uF  (hidden comment: *)
Capacitor, Ceramic (MLCC), 10uF, ±20%, 50V, X7R, ±20%, SMD 1210; Manufacturer: HRE; Manufacturer Part Number: CGA1210X7R106M500RT; Package Size: 1210; JLCPCB Basic Part: No; JLCPCB Part Number: C6120030; Supplier 1: LCSC; Category: Capacitors - MLCC; Supplier Part Number 1: C6120030; Tolerance: ±20%; Voltage Rating: 50V; Temperature Coefficient: X7R; RoHS: Yes; ComponentLink1Description: Datasheet; ComponentLink2Description: JLCPCB Part URL; ComponentLink2URL: https://jlcpcb.com/partdetail/C6120030; ComponentLink3Description: LCSC Part URL; ComponentLink3URL: https://lcsc.com/product-detail/Multilayer-Ceramic-Capacitors-MLCC---SMD-SMT_HRE-HRE-CGA1210X7R106M500RT_C6120030.html
footprint CAP-1210 (1210 (3225M) Capacitor)
pins: 1, 2

## CGA1210X7R226K250RT
designator C?  Capacitance: 22uF  (hidden comment: *)
Capacitor, Ceramic (MLCC), 22uF, ±10%, 25V, X7R, ±10%, SMD 1210; Manufacturer: HRE; Manufacturer Part Number: CGA1210X7R226K250RT; Package Size: 1210; JLCPCB Basic Part: No; JLCPCB Part Number: C6120032; Supplier 1: LCSC; Category: Capacitors - MLCC; Supplier Part Number 1: C6120032; Tolerance: ±10%; Voltage Rating: 25V; Temperature Coefficient: X7R; RoHS: Yes; ComponentLink1Description: Datasheet; ComponentLink2Description: JLCPCB Part URL; ComponentLink2URL: https://jlcpcb.com/partdetail/C6120032; ComponentLink3Description: LCSC Part URL; ComponentLink3URL: https://lcsc.com/product-detail/Multilayer-Ceramic-Capacitors-MLCC---SMD-SMT_HRE-HRE-CGA1210X7R226K250RT_C6120032.html
footprint CAP-1210 (1210 (3225M) Capacitor)
pins: 1, 2

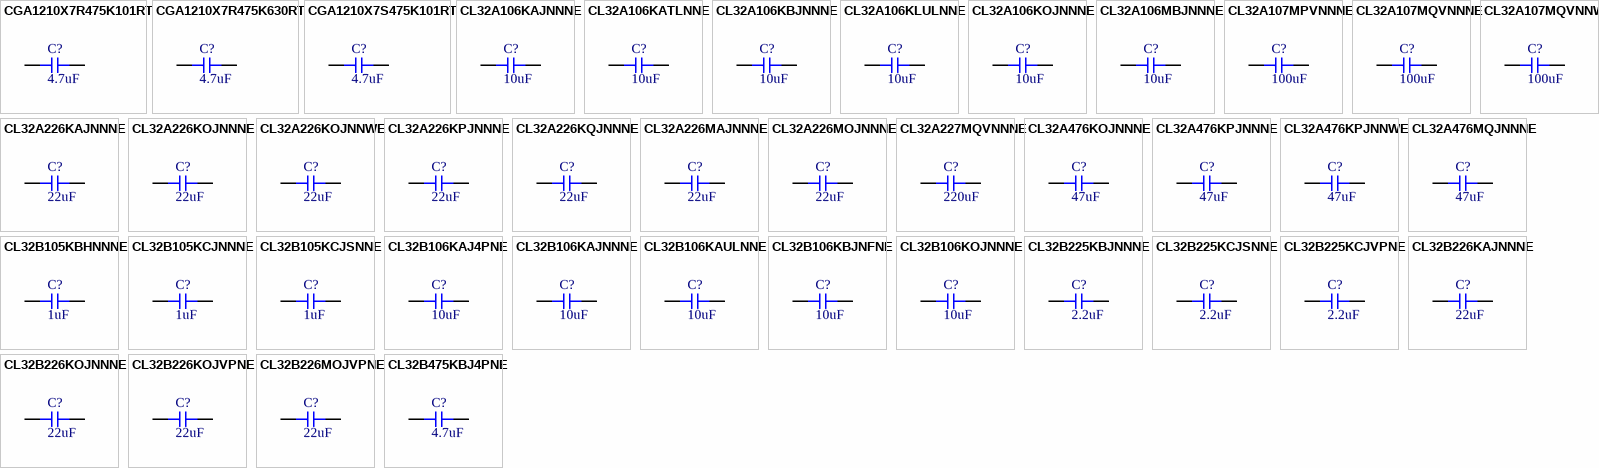
[diagram p9: symbols CGA1210X7R475K101RT to CL32B475KBJ4PNE]

## CGA1210X7R475K101RT
designator C?  Capacitance: 4.7uF  (hidden comment: *)
Capacitor, Ceramic (MLCC), 4.7uF, ±10%, 100V, X7R, ±10%, SMD 1210; Manufacturer: HRE; Manufacturer Part Number: CGA1210X7R475K101RT; Package Size: 1210; JLCPCB Basic Part: No; JLCPCB Part Number: C6120033; Supplier 1: LCSC; Category: Capacitors - MLCC; Supplier Part Number 1: C6120033; Tolerance: ±10%; Voltage Rating: 100V; Temperature Coefficient: X7R; RoHS: Yes; ComponentLink1Description: Datasheet; ComponentLink1URL: https://wmsc.lcsc.com/wmsc/upload/file/pdf/v2/lcsc/2404251120_HRE-CGA1210X7R475K101RT_C6120033.pdf; ComponentLink2Description: JLCPCB Part URL; ComponentLink2URL: https://jlcpcb.com/partdetail/C6120033; ComponentLink3Description: LCSC Part URL; ComponentLink3URL: https://lcsc.com/product-detail/Multilayer-Ceramic-Capacitors-MLCC---SMD-SMT_HRE-HRE-CGA1210X7R475K101RT_C6120033.html
footprint CAP-1210 (1210 (3225M) Capacitor)
pins: 1, 2

## CGA1210X7R475K630RT
designator C?  Capacitance: 4.7uF  (hidden comment: *)
Capacitor, Ceramic (MLCC), 4.7uF, ±10%, 63V, X7R, ±10%, SMD 1210; Manufacturer: HRE; Manufacturer Part Number: CGA1210X7R475K630RT; Package Size: 1210; JLCPCB Basic Part: No; JLCPCB Part Number: C6120035; Supplier 1: LCSC; Category: Capacitors - MLCC; Supplier Part Number 1: C6120035; Tolerance: ±10%; Voltage Rating: 63V; Temperature Coefficient: X7R; RoHS: Yes; ComponentLink1Description: Datasheet; ComponentLink2Description: JLCPCB Part URL; ComponentLink2URL: https://jlcpcb.com/partdetail/C6120035; ComponentLink3Description: LCSC Part URL; ComponentLink3URL: https://lcsc.com/product-detail/Multilayer-Ceramic-Capacitors-MLCC---SMD-SMT_HRE-HRE-CGA1210X7R475K630RT_C6120035.html
footprint CAP-1210 (1210 (3225M) Capacitor)
pins: 1, 2

## CGA1210X7S475K101RT
designator C?  Capacitance: 4.7uF  (hidden comment: *)
Capacitor, Ceramic (MLCC), 4.7uF, ±10%, 100V, X7S, ±10%, SMD 1210; Manufacturer: HRE; Manufacturer Part Number: CGA1210X7S475K101RT; Package Size: 1210; JLCPCB Basic Part: No; JLCPCB Part Number: C6120041; Supplier 1: LCSC; Category: Capacitors - MLCC; Supplier Part Number 1: C6120041; Tolerance: ±10%; Voltage Rating: 100V; Temperature Coefficient: X7S; RoHS: Yes; ComponentLink1Description: Datasheet; ComponentLink2Description: JLCPCB Part URL; ComponentLink2URL: https://jlcpcb.com/partdetail/C6120041; ComponentLink3Description: LCSC Part URL; ComponentLink3URL: https://lcsc.com/product-detail/Multilayer-Ceramic-Capacitors-MLCC---SMD-SMT_HRE-HRE-CGA1210X7S475K101RT_C6120041.html
footprint CAP-1210 (1210 (3225M) Capacitor)
pins: 1, 2

## CL32A106KAJNNNE
designator C?  Capacitance: 10uF  (hidden comment: *)
Capacitor, Ceramic (MLCC), 10uF, ±10%, 25V, X5R, ±10%, SMD 1210; Manufacturer: Samsung Electro-Mechanics; Manufacturer Part Number: CL32A106KAJNNNE; Package Size: 1210; JLCPCB Basic Part: No; JLCPCB Part Number: C66120; Supplier 1: LCSC; Category: Capacitors - MLCC; Supplier Part Number 1: C66120; Tolerance: ±10%; Voltage Rating: 25V; Temperature Coefficient: X5R; RoHS: Yes; ComponentLink1Description: Datasheet; ComponentLink1URL: https://wmsc.lcsc.com/wmsc/upload/file/pdf/v2/lcsc/2304140030_Samsung-Electro-Mechanics-CL32A106KAJNNNE_C66120.pdf; ComponentLink2Description: JLCPCB Part URL; ComponentLink2URL: https://jlcpcb.com/partdetail/C66120; ComponentLink3Description: LCSC Part URL; ComponentLink3URL: https://lcsc.com/product-detail/Multilayer-Ceramic-Capacitors-MLCC---SMD-SMT_Samsung-Electro-Mechanics-Samsung-Electro-Mechanics-CL32A106KAJNNNE_C66120.html; ComponentLink4Description: Samsung Component Library; ComponentLink4URL: https://weblib.samsungsem.com/mlcc/mlcc-ec.do?partNumber=CL32A106KAJNNN
footprint CAP-1210 (1210 (3225M) Capacitor)
pins: 1, 2

## CL32A106KATLNNE
designator C?  Capacitance: 10uF  (hidden comment: *)
Capacitor, Ceramic (MLCC), 10uF, ±10%, 25V, X5R, ±10%, SMD 1210; Manufacturer: Samsung Electro-Mechanics; Manufacturer Part Number: CL32A106KATLNNE; Package Size: 1210; JLCPCB Basic Part: No; JLCPCB Part Number: C730494; Supplier 1: LCSC; Category: Capacitors - MLCC; Supplier Part Number 1: C730494; Tolerance: ±10%; Voltage Rating: 25V; Temperature Coefficient: X5R; RoHS: Yes; ComponentLink1Description: Datasheet; ComponentLink1URL: https://wmsc.lcsc.com/wmsc/upload/file/pdf/v2/lcsc/2008252037_Samsung-Electro-Mechanics-CL32A106KATLNNE_C730494.pdf; ComponentLink2Description: JLCPCB Part URL; ComponentLink2URL: https://jlcpcb.com/partdetail/C730494; ComponentLink3Description: LCSC Part URL; ComponentLink3URL: https://lcsc.com/product-detail/Multilayer-Ceramic-Capacitors-MLCC---SMD-SMT_Samsung-Electro-Mechanics-Samsung-Electro-Mechanics-CL32A106KATLNNE_C730494.html; ComponentLink4Description: Samsung Component Library; ComponentLink4URL: https://weblib.samsungsem.com/mlcc/mlcc-ec.do?partNumber=CL32A106KATLNN
footprint CAP-1210 (1210 (3225M) Capacitor)
pins: 1, 2

## CL32A106KBJNNNE
designator C?  Capacitance: 10uF  (hidden comment: *)
Capacitor, Ceramic (MLCC), 10uF, ±10%, 50V, X5R, ±10%, SMD 1210; Manufacturer: Samsung Electro-Mechanics; Manufacturer Part Number: CL32A106KBJNNNE; Package Size: 1210; JLCPCB Basic Part: No; JLCPCB Part Number: C380537; Supplier 1: LCSC; Category: Capacitors - MLCC; Supplier Part Number 1: C380537; Tolerance: ±10%; Voltage Rating: 50V; Temperature Coefficient: X5R; RoHS: Yes; ComponentLink1Description: Datasheet; ComponentLink1URL: https://wmsc.lcsc.com/wmsc/upload/file/pdf/v2/lcsc/1912111437_Samsung-Electro-Mechanics-CL32A106KBJNNNE_C380537.pdf; ComponentLink2Description: JLCPCB Part URL; ComponentLink2URL: https://jlcpcb.com/partdetail/C380537; ComponentLink3Description: LCSC Part URL; ComponentLink3URL: https://lcsc.com/product-detail/Multilayer-Ceramic-Capacitors-MLCC---SMD-SMT_Samsung-Electro-Mechanics-Samsung-Electro-Mechanics-CL32A106KBJNNNE_C380537.html; ComponentLink4Description: Samsung Component Library; ComponentLink4URL: https://weblib.samsungsem.com/mlcc/mlcc-ec.do?partNumber=CL32A106KBJNNN
footprint CAP-1210 (1210 (3225M) Capacitor)
pins: 1, 2